# Altium footprint library Generic Footprint.PcbLib: 160 footprints (part 18 of 20) (continued)
## Symbol_FCC-Logo-15x10_Silkscreen [mil] (continued)
1(488.56,160.25) 1(488.56,290.76) 1(488.56,291.43) 1(488.56,292.77) 1(488.56,325.57) 1(489.23,21.71) 1(489.23,22.38) 1(489.23,23.05) 1(489.23,81.94) 1(489.23,82.61) 1(489.23,290.09) 1(489.23,290.76) 1(489.23,292.1) 1(489.23,385.8) 1(489.23,386.47) 1(489.23,387.14) 1(489.9,23.72) 1(489.9,83.28) 1(489.9,83.95) 1(489.9,116.75) 1(489.9,117.42) 1(489.9,290.09) 1(489.9,291.43) 1(489.9,324.9) 1(489.9,385.13) 1(490.57,22.38) 1(490.57,23.72) 1(490.57,82.61) 1(490.57,83.28) 1(490.57,84.62) 1(490.57,118.09) 1(490.57,119.42) 1(490.57,290.76) 1(490.57,324.23) 1(490.57,386.47) 1(491.24,23.05) 1(491.24,24.39) 1(491.24,83.95) 1(491.24,85.29) 1(491.24,118.76) 1(491.24,119.42) 1(491.24,120.09) 1(491.24,288.09) 1(491.24,290.09) 1(491.24,323.56) 1(491.24,324.23) 1(491.24,324.9) 1(491.24,384.46) 1(491.24,385.13) 1(491.24,385.8) 1(491.9,23.05) 1(491.9,83.95) 1(491.9,84.62) 1(491.9,119.42) 1(491.9,120.09) 1(491.9,120.76) 1(491.9,121.43) 1(491.9,287.42) 1(491.9,289.42) 1(491.9,324.9) 1(491.9,385.8) 1(492.57,24.39) 1(492.57,25.05) 1(492.57,85.96) 1(492.57,120.76) 1(492.57,286.75) 1(492.57,288.09) 1(492.57,288.76) 1(492.57,322.89) 1(492.57,323.56) 1(492.57,324.23) 1(492.57,383.8) 1(492.57,384.46) 1(492.57,385.13) 1(493.24,23.72) 1(493.24,25.05) 1(493.24,84.62) 1(493.24,85.29) 1(493.24,120.09) 1(493.24,120.76) 1(493.24,121.43) 1(493.24,122.1) 1(493.24,122.77) 1(493.24,286.08) 1(493.24,287.42) 1(493.24,288.09) 1(493.24,322.22) 1(493.91,85.29) 1(493.91,86.63) 1(493.91,121.43) 1(493.91,122.1) 1(493.91,285.41) 1(493.91,286.75) 1(493.91,287.42) 1(493.91,321.55) 1(493.91,322.89) 1(493.91,323.56) 1(493.91,383.13) 1(493.91,383.8) 1(494.58,87.3) 1(494.58,87.97) 1(494.58,122.1) 1(494.58,122.77) 1(494.58,123.44) 1(494.58,124.11) 1(494.58,285.41) 1(494.58,286.08) 1(494.58,286.75) 1(494.58,320.88) 1(494.58,322.89) 1(494.58,384.46) 1(495.25,24.39) 1(495.25,87.3) 1(495.25,122.77) 1(495.25,123.44) 1(495.25,124.11) 1(495.25,286.08) 1(495.25,383.13) 1(495.92,88.64) 1(495.92,285.41) 1(495.92,320.21) 1(496.59,25.05) 1(496.59,26.39) 1(496.59,27.06) 1(496.59,87.3) 1(496.59,123.44) 1(496.59,124.11) 1(496.59,124.78) 1(496.59,126.12) 1(496.59,284.74) 1(496.59,319.54) 1(496.59,383.8) 1(497.26,89.31) 1(497.26,125.45) 1(497.26,126.12) 1(497.26,126.79) 1(497.26,127.46) 1(497.26,282.06) 1(497.26,283.4) 1(497.26,284.07) 1(497.26,318.87) 1(497.26,320.21) 1(497.93,25.72) 1(497.93,26.39) 1(497.93,27.06) 1(497.93,27.73) 1(497.93,89.31) 1(497.93,89.98) 1(497.93,126.12) 1(497.93,126.79) 1(497.93,128.13) 1(497.93,128.79) 1(497.93,280.05) 1(497.93,280.72) 1(497.93,282.06) 1(497.93,282.73) 1(497.93,319.54) 1(497.93,320.21) 1(497.93,383.13) 1(498.6,26.39) 1(498.6,89.31) 1(498.6,89.98) 1(498.6,90.65) 1(498.6,91.31) 1(498.6,126.79) 1(498.6,127.46) 1(498.6,128.13) 1(498.6,129.46) 1(498.6,280.72) 1(498.6,282.06) 1(498.6,318.2) 1(498.6,381.12) 1(498.6,382.46) 1(499.27,27.73) 1(499.27,89.98) 1(499.27,91.98) 1(499.27,127.46) 1(499.27,279.39) 1(499.27,281.39) 1(499.27,318.2) 1(499.27,319.54) 1(499.27,381.12) 1(499.94,27.06) 1(499.94,28.4) 1(499.94,128.13) 1(499.94,129.46) 1(499.94,130.13) 1(499.94,279.39) 1(499.94,280.72) 1(499.94,316.87) 1(499.94,317.54) 1(499.94,380.45) 1(499.94,381.79) 1(500.61,129.46) 1(500.61,130.13) 1(500.61,130.8) 1(500.61,131.47) 1(500.61,277.38) 1(500.61,279.39) 1(500.61,317.54) 1(500.61,318.2) 1(500.61,379.78) 1(500.61,380.45) 1(501.27,27.73) 1(501.27,28.4) 1(501.27,29.07) 1(501.27,92.65) 1(501.27,130.13) 1(501.27,130.8) 1(501.27,131.47) 1(501.27,277.38) 1(501.27,278.72) 1(501.27,316.2) 1(501.27,316.87) 1(501.27,317.54) 1(501.27,379.11) 1(501.27,379.78) 1(501.27,380.45) 1(501.27,381.12) 1(501.94,93.32) 1(501.94,130.8) 1(501.94,131.47) 1(501.94,132.14) 1(501.94,133.48) 1(501.94,275.37) 1(501.94,276.71) 1(501.94,277.38) 1(501.94,278.05) 1(501.94,314.86) 1(501.94,315.53) 1(501.94,316.2) 1(501.94,316.87) 1(501.94,378.44) 1(502.61,28.4) 1(502.61,29.07) 1(502.61,29.74) 1(502.61,93.99) 1(502.61,274.7) 1(502.61,314.19) 1(502.61,315.53) 1(502.61,316.2) 1(503.28,29.07) 1(503.28,29.74) 1(503.28,93.32) 1(503.28,93.99) 1(503.28,94.66) 1(503.28,132.81) 1(503.28,133.48) 1(503.28,134.82) 1(503.28,135.49) 1(503.28,274.03) 1(503.28,274.7) 1(503.28,275.37) 1(503.28,276.04) 1(503.28,313.52) 1(503.28,314.86) 1(503.28,315.53) 1(503.28,377.77) 1(503.28,379.11) 1(503.28,379.78) 1(503.95,93.32) 1(503.95,93.99) 1(503.95,94.66) 1(503.95,95.33) 1(503.95,133.48) 1(503.95,134.82) 1(503.95,136.16) 1(503.95,136.83) 1(503.95,272.02) 1(503.95,272.69) 1(503.95,273.36) 1(503.95,274.03) 1(503.95,275.37) 1(503.95,312.85) 1(503.95,314.19) 1(503.95,314.86) 1(503.95,378.44) 1(504.62,94.66) 1(504.62,95.33) 1(504.62,96) 1(504.62,134.15) 1(504.62,134.82) 1(504.62,135.49) 1(504.62,136.16) 1(504.62,136.83) 1(504.62,137.5) 1(504.62,271.35) 1(504.62,272.02) 1(504.62,272.69) 1(504.62,274.03) 1(504.62,274.7) 1(504.62,313.52) 1(504.62,314.19) 1(504.62,377.77) 1(504.62,379.11) 1(505.29,29.74) 1(505.29,95.33) 1(505.29,96.67) 1(505.29,135.49) 1(505.29,136.16) 1(505.29,136.83) 1(505.29,137.5) 1(505.29,138.17) 1(505.29,138.83) 1(505.29,270.02) 1(505.29,270.68) 1(505.29,272.02) 1(505.29,272.69) 1(505.29,312.18) 1(505.29,312.85) 1(505.29,313.52) 1(505.29,377.1) 1(505.29,378.44) 1(505.96,30.41) 1(505.96,97.34) 1(505.96,137.5) 1(505.96,310.84) 1(505.96,311.51) 1(505.96,312.18) 1(505.96,312.85) 1(505.96,377.1) 1(506.63,31.75) 1(506.63,98.01) 1(506.63,138.17) 1(506.63,138.83) 1(506.63,139.5) 1(506.63,140.17) 1(506.63,268.68) 1(506.63,269.35) 1(506.63,270.02) 1(506.63,310.17) 1(506.63,311.51) 1(506.63,312.18) 1(506.63,377.77) 1(507.3,31.08) 1(507.3,31.75) 1(507.3,32.42) 1(507.3,98.01) 1(507.3,98.68) 1(507.3,138.17) 1(507.3,138.83) 1(507.3,139.5) 1(507.3,140.17) 1(507.3,140.84) 1(507.3,267.34) 1(507.3,268.01) 1(507.3,268.68) 1(507.3,270.02) 1(507.3,310.84) 1(507.3,311.51) 1(507.97,31.75) 1(507.97,32.42) 1(507.97,33.09) 1(507.97,98.01) 1(507.97,98.68) 1(507.97,99.35) 1(507.97,139.5) 1(507.97,140.17) 1(507.97,267.34) 1(507.97,268.01) 1(507.97,309.5) 1(507.97,310.17) 1(507.97,310.84) 1(507.97,377.1) 1(508.64,33.76) 1(508.64,98.68) 1(508.64,99.35) 1(508.64,100.02) 1(508.64,144.86) 1(508.64,145.53) 1(508.64,267.34) 1(508.64,268.01) 1(508.64,268.68) 1(508.64,308.17) 1(508.64,308.83) 1(508.64,309.5) 1(508.64,310.17) 1(508.64,376.43) 1(509.31,100.02) 1(509.31,100.68) 1(509.31,141.51) 1(509.31,142.85) 1(509.31,263.32) 1(509.31,263.99) 1(509.31,266) 1(509.31,307.5) 1(509.31,308.83) 1(509.31,309.5) 1(509.31,374.42) 1(509.98,32.42) 1(509.98,33.09) 1(509.98,33.76) 1(509.98,34.42) 1(509.98,99.35) 1(509.98,100.68) 1(509.98,101.35) 1(509.98,142.18) 1(509.98,146.2) 1(509.98,262.65) 1(509.98,264.66) 1(509.98,266.67) 1(509.98,306.83) 1(509.98,308.17) 1(509.98,308.83) 1(509.98,375.76) 1(510.64,33.09) 1(510.64,34.42) 1(510.64,35.09) 1(510.64,100.02) 1(510.64,100.68) 1(510.64,101.35) 1(510.64,102.02) 1(510.64,143.52) 1(510.64,144.19) 1(510.64,146.87) 1(510.64,147.54) 1(510.64,260.65) 1(510.64,261.31) 1(510.64,261.98) 1(510.64,263.32) 1(510.64,265.33) 1(510.64,306.16) 1(510.64,307.5) 1(510.64,308.17) 1(510.64,373.76) 1(510.64,374.42) 1(510.64,375.09) 1(511.31,33.76) 1(511.31,101.35) 1(511.31,102.02) 1(511.31,102.69) 1(511.31,146.87) 1(511.31,147.54) 1(511.31,148.2) 1(511.31,148.87) 1(511.31,259.98) 1(511.31,261.31) 1(511.31,261.98) 1(511.31,263.32) 1(511.31,306.83) 1(511.31,307.5) 1(511.98,35.09) 1(511.98,35.76) 1(511.98,102.02) 1(511.98,103.36) 1(511.98,146.87) 1(511.98,147.54) 1(511.98,148.87) 1(511.98,150.21) 1(511.98,258.64) 1(511.98,259.98) 1(511.98,261.31) 1(511.98,261.98) 1(511.98,305.49) 1(511.98,306.16) 1(511.98,306.83) 1(511.98,373.09) 1(511.98,373.76) 1(511.98,374.42) 1(512.65,34.42) 1(512.65,104.03) 1(512.65,149.54) 1(512.65,150.21) 1(512.65,258.64) 1(512.65,259.31) 1(512.65,304.15) 1(512.65,304.82) 1(512.65,306.16) 1(512.65,372.42) 1(512.65,373.09) 1(512.65,373.76) 1(513.32,35.76) 1(513.32,104.7) 1(513.32,148.87) 1(513.32,259.98) 1(513.32,303.48) 1(513.32,304.82) 1(513.32,371.75) 1(513.99,35.09) 1(513.99,104.7) 1(513.99,105.37) 1(513.99,150.21) 1(513.99,150.88) 1(513.99,154.9) 1(513.99,155.57) 1(513.99,253.95) 1(513.99,257.3) 1(513.99,257.97) 1(513.99,258.64) 1(513.99,302.81) 1(513.99,304.15) 1(513.99,304.82) 1(513.99,372.42) 1(514.66,104.7) 1(514.66,105.37) 1(514.66,106.04) 1(514.66,151.55) 1(514.66,152.22) 1(514.66,152.89) 1(514.66,154.9) 1(514.66,155.57) 1(514.66,156.91) 1(514.66,251.94) 1(514.66,253.95) 1(514.66,256.63) 1(514.66,303.48) 1(514.66,304.15) 1(514.66,371.75) 1(514.66,372.42) 1(514.66,373.09) 1(515.33,35.76) 1(515.33,108.05) 1(515.33,153.56) 1(515.33,154.23) 1(515.33,154.9) 1(515.33,156.91) 1(515.33,157.57) 1(515.33,158.24) 1(515.33,249.27) 1(515.33,249.94) 1(515.33,250.61) 1(515.33,251.94) 1(515.33,253.95) 1(515.33,254.62) 1(515.33,255.29) 1(515.33,255.96) 1(515.33,302.14) 1(515.33,302.81) 1(515.33,303.48) 1(516,36.43) 1(516,105.37) 1(516,106.71) 1(516,107.38) 1(516,108.72) 1(516,155.57) 1(516,156.24) 1(516,158.91) 1(516,251.28) 1(516,252.61) 1(516,253.28) 1(516,301.47) 1(516,302.81) 1(516.67,37.1) 1(516.67,38.44) 1(516.67,108.05) 1(516.67,156.91) 1(516.67,158.24) 1(516.67,158.91) 1(516.67,247.93) 1(516.67,248.6) 1(516.67,249.94) 1(516.67,250.61) 1(516.67,251.94) 1(516.67,299.46) 1(516.67,300.13) 1(516.67,300.8) 1(516.67,371.75) 1(517.34,38.44) 1(517.34,39.11) 1(517.34,108.05) 1(517.34,109.39) 1(517.34,158.24) 1(517.34,158.91) 1(517.34,247.93) 1(517.34,248.6) 1(517.34,249.94) 1(517.34,250.61) 1(517.34,300.13) 1(517.34,369.74) 1(517.34,371.08) 1(518.01,37.77) 1(518.01,39.11) 1(518.01,110.05) 1(518.01,160.25) 1(518.01,247.93) 1(518.01,248.6) 1(518.01,298.8) 1(518.01,299.46) 1(518.01,300.13) 1(518.01,369.07) 1(518.01,369.74) 1(518.68,38.44) 1(518.68,39.78) 1(518.68,110.05) 1(518.68,112.06) 1(518.68,246.59) 1(518.68,297.46) 1(518.68,298.13) 1(518.68,299.46) 1(518.68,368.4) 1(518.68,369.07) 1(518.68,370.41) 1(519.35,40.45) 1(519.35,110.05) 1(519.35,112.73) 1(519.35,298.13) 1(519.35,367.73) 1(519.35,368.4) 1(519.35,369.07) 1(519.35,369.74) 1(520.01,39.11) 1(520.01,39.78) 1(520.01,41.12) 1(520.01,110.72) 1(520.01,112.06) 1(520.01,295.45) 1(520.01,296.12) 1(520.01,297.46) 1(520.01,298.13) 1(520.01,367.06) 1(520.01,367.73) 1(520.01,368.4) 1(520.68,39.78) 1(520.68,40.45) 1(520.68,41.12) 1(520.68,41.79) 1(520.68,111.39) 1(520.68,112.73) 1(520.68,113.4) 1(520.68,296.12) 1(520.68,297.46) 1(521.35,40.45) 1(521.35,112.06) 1(521.35,293.44) 1(521.35,294.11) 1(521.35,294.78) 1(521.35,296.12) 1(521.35,296.79) 1(521.35,366.39) 1(521.35,367.06) 1(522.02,41.79) 1(522.02,42.46) 1(522.02,292.77) 1(522.02,367.73) 1(522.69,41.12) 1(522.69,293.44) 1(522.69,365.72) 1(522.69,366.39) 1(522.69,367.06) 1(523.36,41.79) 1(523.36,42.46) 1(524.03,42.46) 1(524.03,365.72) 1(524.03,366.39) 1(524.7,44.46) 1(524.7,363.72) 1(524.7,365.72) 1(525.37,43.13) 1(525.37,44.46) 1(525.37,45.13) 1(525.37,365.05) 1(526.04,43.79) 1(526.04,363.72) 1(526.71,44.46) 1(526.71,45.13) 1(526.71,45.8) 1(526.71,362.38) 1(526.71,363.05) 1(526.71,364.39) 1(527.38,45.13) 1(527.38,45.8) 1(527.38,46.47) 1(527.38,362.38) 1(527.38,363.05) 1(527.38,363.72) 1(528.05,47.14) 1(528.05,363.05) 1(528.72,45.8) 1(528.72,46.47) 1(528.72,47.14) 1(528.72,360.37) 1(528.72,362.38) 1(529.38,46.47) 1(529.38,361.71) 1(530.05,47.14) 1(530.05,359.7) 1(530.05,360.37) 1(530.72,47.81) 1(530.72,361.04) 1(531.39,49.15) 1(531.39,359.7) 1(531.39,360.37) 1(532.06,49.15) 1(532.06,49.82) 1(532.06,359.7) 1(532.73,48.48) 1(532.73,49.82) 1(532.73,50.49) 1(532.73,357.69) 1(533.4,49.15) 1(533.4,50.49) 1(533.4,51.16) 1(533.4,357.02) 1(534.07,49.82) 1(534.07,50.49) 1(534.07,51.16) 1(534.07,51.83) 1(534.07,52.5) 1(534.07,356.35) 1(534.07,357.69) 1(534.07,358.36) 1(534.07,359.03) 1(534.74,51.16) 1(534.74,51.83) 1(534.74,355.68) 1(534.74,357.02) 1(534.74,357.69) 1(535.41,51.83) 1(535.41,52.5) 1(535.41,356.35) 1(535.41,357.02) 1(536.08,355.68) 1(536.08,356.35) 1(536.75,353.68) 1(536.75,355.68) 1(537.42,52.5) 1(537.42,353.68) 1(537.42,355.02) 1(538.09,53.16) 1(538.09,53.83) 1(538.09,55.17) 1(538.09,55.84) 1(538.09,354.35) 1(538.75,55.17) 1(538.75,353.68) 1(539.42,54.5) 1(539.42,55.84) 1(539.42,56.51) 1(540.09,55.17) 1(540.09,56.51) 1(540.09,57.18) 1(540.09,57.85) 1(540.09,351) 1(540.09,351.67) 1(540.76,55.84) 1(540.76,57.18) 1(540.76,58.52) 1(540.76,350.33) 1(540.76,351.67) 1(540.76,352.34) 1(540.76,353.01) 1(541.43,56.51) 1(541.43,57.18) 1(541.43,57.85) 1(541.43,349.66) 1(541.43,350.33) 1(541.43,351) 1(541.43,351.67) 1(542.1,57.85) 1(542.1,58.52) 1(542.1,59.19) 1(542.1,351) 1(542.77,59.19) 1(542.77,349.66) 1(542.77,350.33) 1(543.44,58.52) 1(544.11,59.19) 1(544.11,61.2) 1(544.11,346.98) 1(544.11,347.65) 1(544.11,349.66) 1(544.78,59.86) 1(544.78,60.53) 1(544.78,61.2) 1(544.78,61.87) 1(544.78,62.54) 1(544.78,346.31) 1(544.78,347.65) 1(544.78,348.32) 1(544.78,348.99) 1(545.45,61.87) 1(545.45,63.2) 1(545.45,345.65) 1(545.45,346.98) 1(545.45,347.65) 1(546.12,61.2) 1(546.12,62.54) 1(546.12,346.31) 1(546.12,346.98) 1(546.79,61.87) 1(546.79,63.2) 1(546.79,63.87) 1(546.79,344.31) 1(546.79,344.98) 1(546.79,345.65) 1(546.79,346.31) 1(547.46,62.54) 1(547.46,63.87) 1(547.46,64.54) 1(547.46,65.21) 1(547.46,343.64) 1(547.46,344.98) 1(547.46,345.65) 1(548.12,63.2) 1(548.12,63.87) 1(548.12,64.54) 1(548.12,342.97) 1(548.12,343.64) 1(548.12,344.31) 1(548.12,344.98) 1(548.79,65.21) 1(548.79,342.97) 1(548.79,344.31) 1(549.46,64.54) 1(549.46,343.64) 1(550.13,65.21) 1(550.13,67.22) 1(550.13,340.96) 1(550.13,341.63) 1(550.8,65.88) 1(550.8,67.22) 1(550.8,67.89) 1(550.8,68.56) 1(550.8,339.62) 1(550.8,340.29) 1(550.8,340.96) 1(550.8,341.63) 1(550.8,342.97) 1(551.47,66.55) 1(551.47,67.89) 1(551.47,69.23) 1(551.47,338.95) 1(551.47,339.62) 1(551.47,341.63) 1(551.47,342.3) 1(552.14,67.22) 1(552.14,68.56) 1(552.14,338.28) 1(552.14,340.96) 1(552.81,67.89) 1(552.81,69.23) 1(552.81,69.9) 1(552.81,337.61) 1(552.81,338.95) 1(552.81,339.62) 1(553.48,68.56) 1(553.48,69.9) 1(553.48,70.57) 1(553.48,336.94) 1(553.48,337.61) 1(553.48,338.28) 1(553.48,338.95) 1(554.15,69.23) 1(554.15,70.57) 1(554.15,336.28) 1(554.15,338.28) 1(554.82,69.9) 1(554.82,70.57) 1(554.82,336.28) 1(554.82,336.94) 1(554.82,337.61) 1(555.49,71.24) 1(555.49,71.91) 1(555.49,73.24) 1(555.49,334.94) 1(555.49,336.94) 1(556.16,73.24) 1(556.16,73.91) 1(556.16,334.27) 1(556.83,72.57) 1(556.83,73.91) 1(556.83,74.58) 1(556.83,332.93) 1(556.83,333.6) 1(556.83,334.94) 1(556.83,336.28) 1(557.49,73.24) 1(557.49,73.91) 1(557.49,74.58) 1(557.49,75.25) 1(557.49,75.92) 1(557.49,332.26) 1(557.49,332.93) 1(557.49,334.94) 1(557.49,335.61) 1(558.16,74.58) 1(558.16,75.25) 1(558.16,76.59) 1(558.16,331.59) 1(558.16,332.26) 1(558.83,75.25) 1(558.83,76.59) 1(558.83,330.92) 1(558.83,331.59) 1(558.83,332.93) 1(559.5,76.59) 1(559.5,330.25) 1(559.5,330.92) 1(559.5,332.26) 1(560.17,77.26) 1(560.17,78.6) 1(560.17,330.25) 1(560.17,331.59) 1(560.84,77.93) 1(560.84,78.6) 1(560.84,79.27) 1(560.84,328.91) 1(560.84,330.25) 1(560.84,330.92) 1(561.51,78.6) 1(561.51,79.27) 1(561.51,327.57) 1(561.51,328.24) 1(561.51,328.91) 1(561.51,329.58) 1(562.18,79.27) 1(562.18,79.94) 1(562.18,80.61) 1(562.18,81.94) 1(562.18,327.57) 1(562.18,328.24) 1(562.18,328.91) 1(562.85,326.24) 1(562.85,326.91) 1(562.85,328.24) 1(563.52,81.28) 1(563.52,81.94) 1(563.52,82.61) 1(563.52,83.28) 1(563.52,327.57) 1(564.19,81.94) 1(564.19,82.61) 1(564.19,83.28) 1(564.19,83.95) 1(564.19,84.62) 1(564.19,323.56) 1(564.19,324.23) 1(564.86,82.61) 1(564.86,83.28) 1(564.86,84.62) 1(564.86,85.29) 1(564.86,322.89) 1(564.86,324.23) 1(564.86,325.57) 1(565.53,85.96) 1(565.53,322.22) 1(565.53,322.89) 1(565.53,324.23) 1(565.53,324.9) 1(566.2,84.62) 1(566.2,85.29) 1(566.2,85.96) 1(566.2,322.22) 1(566.86,85.29) 1(566.86,87.3) 1(566.86,87.97) 1(566.86,320.88) 1(566.86,322.89) 1(567.53,85.96) 1(567.53,86.63) 1(567.53,87.3) 1(567.53,87.97) 1(567.53,88.64) 1(567.53,89.31) 1(567.53,318.87) 1(567.53,319.54) 1(567.53,320.21) 1(567.53,320.88) 1(567.53,322.22) 1(568.2,87.3) 1(568.2,88.64) 1(568.2,89.98) 1(568.2,318.2) 1(568.2,318.87) 1(568.2,319.54) 1(568.2,320.88) 1(568.2,321.55) 1(568.87,87.97) 1(568.87,88.64) 1(568.87,89.31) 1(568.87,89.98) 1(568.87,316.87) 1(568.87,317.54) 1(568.87,318.2) 1(569.54,89.31) 1(569.54,90.65) 1(569.54,91.31) 1(569.54,318.2) 1(569.54,318.87) 1(569.54,319.54) 1(570.21,89.98) 1(570.21,91.98) 1(570.21,92.65) 1(570.21,315.53) 1(570.21,316.2) 1(570.21,316.87) 1(570.21,317.54) 1(570.88,91.98) 1(570.88,92.65) 1(570.88,93.32) 1(570.88,314.19) 1(570.88,314.86) 1(570.88,315.53) 1(570.88,316.87) 1(570.88,317.54) 1(571.55,91.98) 1(571.55,92.65) 1(571.55,93.32) 1(571.55,314.19) 1(571.55,314.86) 1(572.22,93.32) 1(572.22,314.19) 1(572.22,314.86) 1(572.22,315.53) 1(572.89,93.99) 1(572.89,96.67) 1(572.89,114.07) 1(572.89,311.51) 1(573.56,94.66) 1(573.56,95.33) 1(573.56,96.67) 1(573.56,112.73) 1(573.56,114.74) 1(573.56,310.17) 1(573.56,310.84) 1(573.56,311.51) 1(573.56,313.52) 1(574.23,96) 1(574.23,98.01) 1(574.23,98.68) 1(574.23,99.35) 1(574.23,113.4) 1(574.23,308.83) 1(574.23,309.5) 1(574.23,310.17) 1(574.23,310.84) 1(574.23,311.51) 1(574.23,312.18) 1(574.23,312.85) 1(574.9,96.67) 1(574.9,97.34) 1(574.9,98.68) 1(574.9,100.02) 1(574.9,100.68) 1(574.9,307.5) 1(574.9,308.17) 1(574.9,308.83) 1(574.9,310.84) 1(575.57,100.68) 1(575.57,101.35) 1(575.57,102.02) 1(575.57,306.16) 1(575.57,306.83) 1(575.57,308.83) 1(575.57,310.17) 1(576.24,98.68) 1(576.24,307.5) 1(576.9,100.68) 1(576.9,102.02) 1(576.9,102.69) 1(576.9,305.49) 1(576.9,306.83) 1(576.9,307.5) 1(577.57,102.02) 1(577.57,102.69) 1(577.57,305.49) 1(577.57,306.83) 1(578.24,102.69) 1(578.24,103.36) 1(578.24,304.15) 1(578.24,304.82) 1(578.24,305.49) 1(578.91,104.03) 1(578.91,104.7) 1(578.91,107.38) 1(578.91,300.13) 1(578.91,300.8) 1(578.91,303.48) 1(579.58,105.37) 1(579.58,106.04) 1(579.58,108.05) 1(579.58,302.81) 1(580.25,107.38) 1(580.25,108.05) 1(580.25,108.72) 1(580.25,109.39) 1(580.25,298.13) 1(580.25,298.8) 1(580.25,299.46) 1(580.25,300.13) 1(580.25,301.47) 1(580.25,302.14) 1(580.92,106.71) 1(580.92,107.38) 1(580.92,108.05) 1(580.92,109.39) 1(580.92,110.05) 1(580.92,110.72) 1(580.92,111.39) 1(580.92,296.79) 1(580.92,297.46) 1(580.92,298.8) 1(580.92,300.13) 1(581.59,109.39) 1(581.59,110.05) 1(581.59,110.72) 1(581.59,112.06) 1(581.59,295.45) 1(581.59,296.12) 1(581.59,297.46) 1(581.59,298.8) 1(582.26,110.05) 1(582.26,110.72) 1(582.26,112.06) 1(582.26,294.78) 1(582.26,295.45) 1(582.26,296.12) 1(582.26,297.46) 1(582.93,294.78) 1(583.6,112.06) 1(583.6,112.73) 1(583.6,113.4) 1(583.6,294.78) 1(583.6,295.45) 1(583.6,296.12) 1(584.27,113.4) 1(584.27,114.07) 1(584.27,294.11) 1(584.94,114.74) 1(584.94,292.77)
Top Overlay:
  drawing of 4310 lines, arcs and shapes, not listed